# Altium footprint library Miscellaneous THD.PcbLib: 216 footprints (part 14 of 15)
Each footprint in its own frame and in the unit in brackets; x right, y up, seen from the top. Pads: shape width x height; smd on the part's side, far side on the other; paste and mask are expansions set on the pad; w line width, h text height; cw(c..) or ccw(c..) is an arc to the next point about the centre after c.
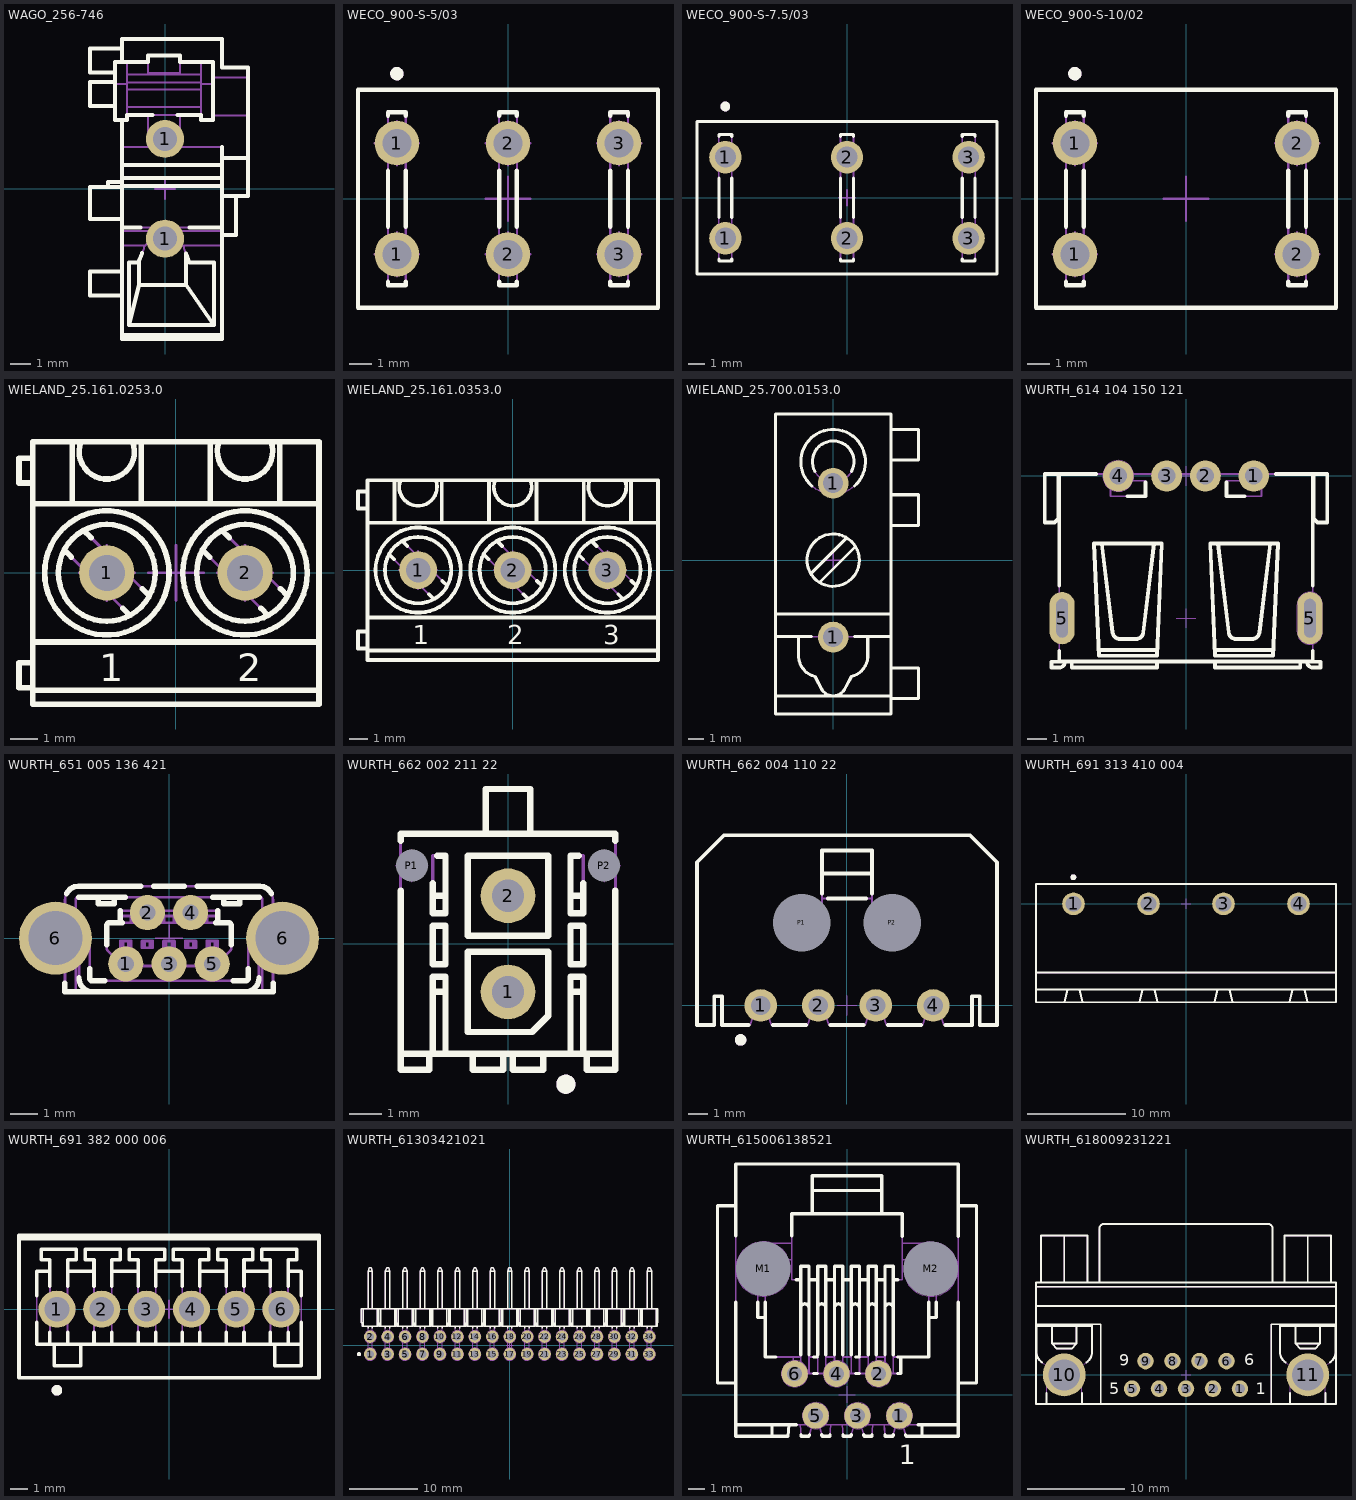
[diagram p13: the footprints below, top view; thin cyan lines are the x and y axes]

## WAGO_256-746 [mm] "24A 630VAC Modular PCB terminal block 2 solder pins / pole 1 pole pin Pitch 5mm, CAGE CLAMP® Connection"
height 18.2
pads (2):
  round 1.9 hole 1.2: 1(0,-2.5) 1(0,2.5)
Top Overlay:
  lines w0.2: -2.85,0.09 -2.85,0.35 -2.15,0.35 ; -2.5,4.135 -3.75,4.135 -3.75,5.335 -2.5,5.335 ; -2.5,5.832 -3.75,5.832 -3.75,7.032 -2.15,7.032 ; -2.15,-7.332 2.85,-7.332 ; -2.15,-5.341 -3.75,-5.341 -3.75,-4.141 -2.15,-4.141 ; -2.15,-1.947 -1.232,-1.947 ; -2.15,-1.51 -3.75,-1.51 -3.75,0.09 -2.15,0.09 ; -2.15,0.138 2.85,0.138 ; -2.15,0.547 2.85,0.547 ; -2.15,1.187 2.85,1.187 ; -2.15,3.448 -2.15,-7.522 2.85,-7.522 2.85,-2.31 ; -2.15,6.349 -2.15,7.5 2.85,7.5 2.85,6.078 4.15,6.078 ; -1.315,-3.68 -1.8,-3.68 -1.8,-6.826 ; -1.144,-3.217 -1.3,-3.599 -1.3,-4.811 ; -0.615,3.702 -1.9,3.702 -1.9,3.448 -2.5,3.448 -2.5,6.349 -0.85,6.349 -0.85,6.669 0.75,6.669 0.75,6.349 2.4,6.349 2.4,3.448 1.8,3.448 1.8,3.702 0.615,3.702 ; 1.05,-3.248 1.05,-4.811 ; 1.076,-3.316 1.215,-3.68 2.45,-3.68 2.45,-6.826 ; 1.232,-1.947 2.85,-1.947 ; 2.85,-1.304 2.85,-2.31 ; 2.85,-0.356 4.15,-0.356 ; 2.85,1.553 4.15,1.553 ; 2.85,2.091 2.85,-2.31 ; 3.55,-0.356 3.55,-2.31 ; -1.8,-6.826 -1.3,-4.811 ; -1.8,-6.826 2.45,-6.826 ; -1.3,-4.811 1.05,-4.811 ; 1.05,-4.811 2.45,-6.826 ; 2.85,-2.31 3.55,-2.31 ; 2.85,-2.31 3.55,-2.31 ; 4.15,-0.356 4.15,6.078 ; 4.15,-0.356 4.15,6.078
Mechanical 8:
  lines w0.1: -0.5,-2.5 0,-2.5 ; -0.5,0 0,0 ; -0.5,2.5 0,2.5 ; 0,-3 0,-2.5 ; 0,-2 0,-2.5 ; 0,-0.5 0,0 ; 0,0.5 0,0 ; 0,2 0,2.5 ; 0,3 0,2.5 ; 0.5,-2.5 0,-2.5 ; 0.5,0 0,0 ; 0.5,2.5 0,2.5
Mechanical 14:
  lines w0.1: -2.85,0.09 -2.85,0.35 -2.15,0.35 ; -2.5,4.135 -3.75,4.135 -3.75,5.335 -2.5,5.335 ; -2.5,5.25 -1.9,5.25 ; -2.5,5.832 -3.75,5.832 -3.75,7.032 -2.15,7.032 ; -2.15,-7.332 2.85,-7.332 ; -2.15,-5.341 -3.75,-5.341 -3.75,-4.141 -2.15,-4.141 ; -2.15,-2.831 -0.989,-2.831 ; -2.15,-2.124 2.85,-2.124 ; -2.15,-1.947 2.85,-1.947 ; -2.15,-1.51 -3.75,-1.51 -3.75,0.09 -2.15,0.09 ; -2.15,0.138 2.85,0.138 ; -2.15,0.547 2.85,0.547 ; -2.15,1.187 2.85,1.187 ; -2.15,2.091 2.85,2.091 2.85,-2.31 ; -2.15,3.448 -2.15,-7.522 2.85,-7.522 2.85,-2.31 ; -2.15,6.349 -2.15,7.5 2.85,7.5 2.85,6.078 4.15,6.078 ; -1.9,3.702 1.8,3.702 ; -1.9,4.091 1.8,4.091 ; -1.9,4.978 1.8,4.978 ; -1.9,5.31 1.8,5.31 ; -1.9,5.728 1.8,5.728 ; -1.9,6.349 -1.9,3.448 -2.5,3.448 -2.5,6.349 -0.85,6.349 ; -1.315,-3.68 -1.8,-3.68 -1.8,-6.826 ; -0.85,2.091 -0.85,3.702 ; -0.85,2.327 0.75,2.327 ; 0.75,2.091 0.75,3.702 ; 0.75,6.349 2.4,6.349 2.4,3.448 1.8,3.448 1.8,6.349 ; 0.888,-2.831 2.85,-2.831 ; 1.05,-3.248 1.05,-4.811 ; 1.8,5.25 2.4,5.25 ; 2.4,3.672 4.15,3.672 ; 2.4,5.573 4.15,5.573 ; 2.85,-0.356 4.15,-0.356 ; 2.85,1.553 4.15,1.553 ; -1.8,-6.826 -1.3,-4.811 ; -1.8,-6.826 2.45,-6.826 ; -1.3,-4.811 -1.3,-3.599 -1.05,-2.986 -1.05,-2.896 cw(c-0.05,-3.785) 0.95,-2.897 0.95,-2.986 1.215,-3.68 2.45,-3.68 2.45,-6.826 ; -1.3,-4.811 1.05,-4.811 ; 1.05,-4.811 2.45,-6.826 ; 2.85,-2.31 3.55,-2.31 ; 2.85,-2.31 3.55,-2.31 ; 3.55,-2.31 3.55,-0.356 3.55,-2.31 ; 4.15,-0.356 4.15,6.078 ; 4.15,-0.356 4.15,6.078 ; -0.85,5.803 0.75,5.803 0.75,6.669 -0.85,6.669 -0.85,5.803
3D body "WAGO_256-746.stp": height 18.81, standoff -4, extent -3.75,-7.525 4.15,7.5

## WECO_900-S-5/03 [mm] "5mm Spacing, 3 Tabs 6.3mmx2.8mm Connectors for Printed Circuit Boards"
height 15
pads (6):
  round 2 hole 1.3: 1(-5,-2.5) 1(-5,2.5) 2(0,-2.5) 2(0,2.5) 3(5,-2.5) 3(5,2.5)
Top Overlay:
  circle w0.3: c-5,5.628 r0.15
  lines w0.2: -5.4,-3.737 -5.4,-3.9 -4.6,-3.9 -4.6,-3.737 ; -5.4,-1.263 -5.4,1.263 ; -5.4,3.737 -5.4,3.9 -4.6,3.9 -4.6,3.737 ; -4.6,-1.263 -4.6,1.263 ; -0.4,-3.737 -0.4,-3.9 0.4,-3.9 0.4,-3.737 ; -0.4,-1.263 -0.4,1.263 ; -0.4,3.737 -0.4,3.9 0.4,3.9 0.4,3.737 ; 0.4,-1.263 0.4,1.263 ; 4.6,-3.737 4.6,-3.9 5.4,-3.9 5.4,-3.737 ; 4.6,-1.263 4.6,1.263 ; 4.6,3.737 4.6,3.9 5.4,3.9 5.4,3.737 ; 5.4,-1.263 5.4,1.263 ; -6.75,-4.9 -6.75,4.9 6.75,4.9 6.75,-4.9 -6.75,-4.9
Mechanical 8:
  lines w0.1: -6,-2.5 -5,-2.5 ; -6,2.5 -5,2.5 ; -5,-3.5 -5,-2.5 ; -5,-1.5 -5,-2.5 ; -5,1.5 -5,2.5 ; -5,3.5 -5,2.5 ; -4,-2.5 -5,-2.5 ; -4,2.5 -5,2.5 ; -1,-2.5 0,-2.5 ; -1,0 0,0 ; -1,2.5 0,2.5 ; 0,-3.5 0,-2.5 ; 0,-1.5 0,-2.5 ; 0,-1 0,0 ; 0,1 0,0 ; 0,1.5 0,2.5 ; 0,3.5 0,2.5 ; 1,-2.5 0,-2.5 ; 1,0 0,0 ; 1,2.5 0,2.5 ; 4,-2.5 5,-2.5 ; 4,2.5 5,2.5 ; 5,-3.5 5,-2.5 ; 5,-1.5 5,-2.5 ; 5,1.5 5,2.5 ; 5,3.5 5,2.5 ; 6,-2.5 5,-2.5 ; 6,2.5 5,2.5
Mechanical 14:
  circle w0.3: c-5,5.628 r0.15
  lines w0.1: -6.75,-4.9 -6.75,4.9 6.75,4.9 6.75,-4.9 -6.75,-4.9 ; -5.4,-3.9 -5.4,3.9 -4.6,3.9 -4.6,-3.9 -5.4,-3.9 ; -0.4,-3.9 -0.4,3.9 0.4,3.9 0.4,-3.9 -0.4,-3.9 ; 4.6,-3.9 4.6,3.9 5.4,3.9 5.4,-3.9 4.6,-3.9
3D body "WECO_900-S-5-03.stp": height 15, standoff -4.5, extent -6.75,-4.9 6.75,4.9

## WECO_900-S-7.5/03 [mm] "7.5mm Spacing, 3 Tabs 6.3mmx2.8mm Connectors for Printed Circuit Boards"
height 15
pads (6):
  round 2 hole 1.3: 1(-7.5,-2.5) 1(-7.5,2.5) 2(0,-2.5) 2(0,2.5) 3(7.5,-2.5) 3(7.5,2.5)
Top Overlay:
  circle w0.3: c-7.5,5.628 r0.15
  lines w0.2: -7.9,-3.789 -7.9,-3.896 -7.1,-3.896 -7.1,-3.789 ; -7.9,-1.211 -7.9,1.211 ; -7.9,3.789 -7.9,3.904 -7.1,3.904 -7.1,3.789 ; -7.1,-1.211 -7.1,1.211 ; -0.4,-3.789 -0.4,-3.896 0.4,-3.896 0.4,-3.789 ; -0.4,-1.211 -0.4,1.211 ; -0.4,3.789 -0.4,3.904 0.4,3.904 0.4,3.789 ; 0.4,-1.211 0.4,1.211 ; 7.1,-3.789 7.1,-3.896 7.9,-3.896 7.9,-3.789 ; 7.1,-1.211 7.1,1.211 ; 7.1,3.789 7.1,3.904 7.9,3.904 7.9,3.789 ; 7.9,-1.211 7.9,1.211 ; -9.25,-4.7 -9.25,4.7 9.25,4.7 9.25,-4.7 -9.25,-4.7
Mechanical 8:
  lines w0.1: -8,-2.5 -7.5,-2.5 ; -8,2.5 -7.5,2.5 ; -7.5,-3 -7.5,-2.5 ; -7.5,-2 -7.5,-2.5 ; -7.5,2 -7.5,2.5 ; -7.5,3 -7.5,2.5 ; -7,-2.5 -7.5,-2.5 ; -7,2.5 -7.5,2.5 ; -0.5,-2.5 0,-2.5 ; -0.5,0 0,0 ; -0.5,2.5 0,2.5 ; 0,-3 0,-2.5 ; 0,-2 0,-2.5 ; 0,-0.5 0,0 ; 0,0.5 0,0 ; 0,2 0,2.5 ; 0,3 0,2.5 ; 0.5,-2.5 0,-2.5 ; 0.5,0 0,0 ; 0.5,2.5 0,2.5 ; 7,-2.5 7.5,-2.5 ; 7,2.5 7.5,2.5 ; 7.5,-3 7.5,-2.5 ; 7.5,-2 7.5,-2.5 ; 7.5,2 7.5,2.5 ; 7.5,3 7.5,2.5 ; 8,-2.5 7.5,-2.5 ; 8,2.5 7.5,2.5
Mechanical 14:
  circle w0.3: c-7.5,5.628 r0.15
  lines w0.1: -9.25,-4.7 -9.25,4.7 9.25,4.7 9.25,-4.7 -9.25,-4.7 ; -7.9,-3.896 -7.9,3.904 -7.1,3.904 -7.1,-3.896 -7.9,-3.896 ; -0.4,-3.896 -0.4,3.904 0.4,3.904 0.4,-3.896 -0.4,-3.896 ; 7.1,-3.896 7.1,3.904 7.9,3.904 7.9,-3.896 7.1,-3.896
3D body "WECO_900-S-7.5-03.stp": height 15, standoff -4.5, extent -9.25,-4.7 9.25,4.7

## WECO_900-S-10/02 [mm] "10mm Spacing, 2 Tabs 6.3mmx2.8mm Connectors for Printed Circuit Boards"
height 15
pads (4):
  round 2 hole 1.3: 1(-5,-2.5) 1(-5,2.5) 2(5,-2.5) 2(5,2.5)
Top Overlay:
  circle w0.3: c-5,5.628 r0.15
  lines w0.2: -5.4,-3.737 -5.4,-3.9 -4.6,-3.9 -4.6,-3.737 ; -5.4,-1.263 -5.4,1.263 ; -5.4,3.737 -5.4,3.9 -4.6,3.9 -4.6,3.737 ; -4.6,-1.263 -4.6,1.263 ; 4.6,-3.737 4.6,-3.9 5.4,-3.9 5.4,-3.737 ; 4.6,-1.263 4.6,1.263 ; 4.6,3.737 4.6,3.9 5.4,3.9 5.4,3.737 ; 5.4,-1.263 5.4,1.263 ; -6.75,-4.9 -6.75,4.9 6.75,4.9 6.75,-4.9 -6.75,-4.9
Mechanical 8:
  lines w0.1: -6,-2.5 -5,-2.5 ; -6,2.5 -5,2.5 ; -5,-3.5 -5,-2.5 ; -5,-1.5 -5,-2.5 ; -5,1.5 -5,2.5 ; -5,3.5 -5,2.5 ; -4,-2.5 -5,-2.5 ; -4,2.5 -5,2.5 ; -1,0 0,0 ; 0,-1 0,0 ; 0,1 0,0 ; 1,0 0,0 ; 4,-2.5 5,-2.5 ; 4,2.5 5,2.5 ; 5,-3.5 5,-2.5 ; 5,-1.5 5,-2.5 ; 5,1.5 5,2.5 ; 5,3.5 5,2.5 ; 6,-2.5 5,-2.5 ; 6,2.5 5,2.5
Mechanical 14:
  circle w0.3: c-5,5.628 r0.15
  lines w0.1: -6.75,-4.9 -6.75,4.9 6.75,4.9 6.75,-4.9 -6.75,-4.9 ; -5.4,-3.9 -5.4,3.9 -4.6,3.9 -4.6,-3.9 -5.4,-3.9 ; 4.6,-3.9 4.6,3.9 5.4,3.9 5.4,-3.9 4.6,-3.9
3D body "WECO_900-S-10-02.stp": height 15, standoff -4.5, extent -6.75,-4.9 6.75,4.9

## WIELAND_25.161.0253.0 [mm] "Terminal Block, Pitch 5mm, 2 Positions, Screw Connection"
height 15
pads (2):
  round 2 hole 1.3: 1(-2.5,0) 2(2.5,0)
Top Overlay:
  circle w0.2: c-2.5,0 r1.75
  circle w0.2: c-2.5,0 r2.25
  circle w0.2: c2.5,0 r1.75
  circle w0.2: c2.5,0 r2.25
  lines w0.2: -5.175,-4.25 5.175,-4.25 ; -5.175,-4.15 -5.675,-4.15 -5.675,-3.25 -5.175,-3.25 ; -5.175,-2.5 5.175,-2.5 ; -5.175,2.5 5.175,2.5 ; -5.175,3.25 -5.675,3.25 -5.675,4.15 -5.175,4.15 ; -4.039,0.832 -3.778,0.571 ; -3.75,2.5 -3.75,4.75 ; -3.433,4.75 ccw(c-2.5,4.391) -1.567,4.75 ; -3.332,1.539 -3.071,1.278 ; -1.929,-1.278 -1.668,-1.539 ; -1.25,2.5 -1.25,4.75 ; -1.222,-0.571 -0.961,-0.832 ; 0.961,0.832 1.222,0.571 ; 1.25,2.5 1.25,4.75 ; 1.567,4.75 ccw(c2.5,4.391) 3.433,4.75 ; 1.668,1.539 1.929,1.278 ; 3.071,-1.278 3.332,-1.539 ; 3.75,2.5 3.75,4.75 ; 3.778,-0.571 4.039,-0.832 ; -5.175,-4.75 -5.175,4.75 5.175,4.75 5.175,-4.75 -5.175,-4.75
  text "1" at -2.78,-3.922 h1
  text "2" at 2.219,-3.922 h1
Mechanical 8:
  lines w0.1: -3.5,0 -2.5,0 ; -2.5,-1 -2.5,0 ; -2.5,1 -2.5,0 ; -1.5,0 -2.5,0 ; -1,0 0,0 ; 0,-1 0,0 ; 0,1 0,0 ; 1,0 0,0 ; 1.5,0 2.5,0 ; 2.5,-1 2.5,0 ; 2.5,1 2.5,0 ; 3.5,0 2.5,0
Mechanical 14:
  circle w0.1: c-2.5,0 r2.25
  circle w0.1: c2.5,0 r2.25
  circle w0.1: c-2.5,0 r1.75
  circle w0.1: c2.5,0 r1.75
  lines w0.1: -5.175,-4.25 5.175,-4.25 ; -5.175,-4.15 -5.675,-4.15 -5.675,-3.25 -5.175,-3.25 ; -5.175,-2.5 5.175,-2.5 ; -5.175,2.5 5.175,2.5 ; -5.175,3.25 -5.675,3.25 -5.675,4.15 -5.175,4.15 ; -4.039,0.832 -1.668,-1.539 ; -3.75,2.5 -3.75,4.75 ; -3.433,4.75 ccw(c-2.5,4.391) -1.567,4.75 ; -3.332,1.539 -0.961,-0.832 ; -1.25,2.5 -1.25,4.75 ; 0.961,0.832 3.332,-1.539 ; 1.25,2.5 1.25,4.75 ; 1.567,4.75 ccw(c2.5,4.391) 3.433,4.75 ; 1.668,1.539 4.039,-0.832 ; 3.75,2.5 3.75,4.75 ; -5.175,-4.75 -5.175,4.75 5.175,4.75 5.175,-4.75 -5.175,-4.75
  text "2" at 2.219,-3.922 h1
  text "1" at -2.78,-3.922 h1
3D body "WIELAND_25.161.0253.0.stp": height 15, standoff -3.4, extent -5.675,-4.75 5.175,4.75

## WIELAND_25.161.0353.0 [mm] "Terminal Block, Pitch 5mm, 3 Positions, Screw Connection"
height 15
pads (3):
  round 2 hole 1.3: 1(-5,0) 2(0,0) 3(5,0)
Top Overlay:
  circle w0.2: c-5,0 r2.25
  circle w0.2: c0,0 r2.25
  circle w0.2: c5,0 r2.25
  circle w0.2: c-5,0 r1.75
  circle w0.2: c0,0 r1.75
  circle w0.2: c5,0 r1.75
  lines w0.2: -7.675,-4.25 7.675,-4.25 ; -7.675,-4.15 -8.175,-4.15 -8.175,-3.25 -7.675,-3.25 ; -7.675,-2.5 7.675,-2.5 ; -7.675,2.5 7.675,2.5 ; -7.675,3.25 -8.175,3.25 -8.175,4.15 -7.675,4.15 ; -6.539,0.832 -6.278,0.571 ; -6.25,2.5 -6.25,4.75 ; -5.933,4.75 ccw(c-5,4.391) -4.067,4.75 ; -5.832,1.539 -5.571,1.278 ; -4.429,-1.278 -4.168,-1.539 ; -3.75,2.5 -3.75,4.75 ; -3.722,-0.571 -3.461,-0.832 ; -1.539,0.832 -1.278,0.571 ; -1.25,2.5 -1.25,4.75 ; -0.933,4.75 ccw(c0,4.391) 0.933,4.75 ; -0.832,1.539 -0.571,1.278 ; 0.571,-1.278 0.832,-1.539 ; 1.25,2.5 1.25,4.75 ; 1.278,-0.571 1.539,-0.832 ; 3.461,0.832 3.722,0.571 ; 3.75,2.5 3.75,4.75 ; 4.067,4.75 ccw(c5,4.391) 5.933,4.75 ; 4.168,1.539 4.429,1.278 ; 5.571,-1.278 5.832,-1.539 ; 6.25,2.5 6.25,4.75 ; 6.278,-0.571 6.539,-0.832 ; -7.675,-4.75 -7.675,4.75 7.675,4.75 7.675,-4.75 -7.675,-4.75
  text "3" at 4.78,-3.922 h1
  text "2" at -0.281,-3.922 h1
  text "1" at -5.28,-3.922 h1
Mechanical 8:
  lines w0.1: -6,0 -5,0 ; -5,-1 -5,0 ; -5,1 -5,0 ; -4,0 -5,0 ; -1,0 0,0 ; 0,-1 0,0 ; 0,1 0,0 ; 1,0 0,0 ; 4,0 5,0 ; 5,-1 5,0 ; 5,1 5,0 ; 6,0 5,0
Mechanical 14:
  circle w0.1: c-5,0 r2.25
  circle w0.1: c0,0 r2.25
  circle w0.1: c5,0 r2.25
  circle w0.1: c-5,0 r1.75
  circle w0.1: c0,0 r1.75
  circle w0.1: c5,0 r1.75
  lines w0.1: -7.675,-4.25 7.675,-4.25 ; -7.675,-4.15 -8.175,-4.15 -8.175,-3.25 -7.675,-3.25 ; -7.675,-2.5 7.675,-2.5 ; -7.675,2.5 7.675,2.5 ; -7.675,3.25 -8.175,3.25 -8.175,4.15 -7.675,4.15 ; -6.539,0.832 -4.168,-1.539 ; -6.25,2.5 -6.25,4.75 ; -5.933,4.75 ccw(c-5,4.391) -4.067,4.75 ; -5.832,1.539 -3.461,-0.832 ; -3.75,2.5 -3.75,4.75 ; -1.539,0.832 0.832,-1.539 ; -1.25,2.5 -1.25,4.75 ; -0.933,4.75 ccw(c0,4.391) 0.933,4.75 ; -0.832,1.539 1.539,-0.832 ; 1.25,2.5 1.25,4.75 ; 3.461,0.832 5.832,-1.539 ; 3.75,2.5 3.75,4.75 ; 4.067,4.75 ccw(c5,4.391) 5.933,4.75 ; 4.168,1.539 6.539,-0.832 ; 6.25,2.5 6.25,4.75 ; -7.675,-4.75 -7.675,4.75 7.675,4.75 7.675,-4.75 -7.675,-4.75
  text "3" at 4.78,-3.922 h1
  text "2" at -0.281,-3.922 h1
  text "1" at -5.28,-3.922 h1
3D body "WIELAND_25.161.0353.0.stp": height 15, standoff -3.4, extent -8.175,-4.75 7.675,4.75

## WIELAND_25.700.0153.0 [mm] "Terminal Block, 1 Pole, Pitch 7.5mm, Screw Connection, Series: 8375/1/7,5"
height 22
pads (2):
  round 2 hole 1.3: 1(0,-5) 1(0,5)
Top Overlay:
  circle w0.2: c0,0 r1.7
  lines w0.2: -3.75,-8.825 3.75,-8.829 ; -3.75,-4.975 -1.4,-4.975 ; -3.75,-3.5 3.75,-3.5 ; -2.25,-4.975 -2.25,-6.306 ccw(c-0.844,-6.198) -1.186,-7.566 -0.726,-8.424 ccw(c0,-7.972) 0.726,-8.424 1.186,-7.566 ccw(c0.844,-6.198) 2.25,-6.306 2.25,-4.975 ; -1.451,-0.885 0.886,1.451 ; -1.389,4.825 cw(c0,6.4) 1.389,4.825 ; -1.183,5.749 cw(c0,6.4) 1.183,5.749 ; -0.885,-1.451 1.451,0.885 ; 1.4,-4.975 3.75,-4.975 ; 3.75,-9 5.55,-9 5.55,-7 3.75,-7 ; 3.75,2.25 5.55,2.25 5.55,4.25 3.75,4.25 ; 3.75,6.5 5.55,6.5 5.55,8.5 3.75,8.5 ; -3.75,-10 -3.75,9.5 3.75,9.5 3.75,-10 -3.75,-10
Mechanical 8:
  lines w0.1: -0.5,-5 0,-5 ; -0.5,0 0,0 ; -0.5,5 0,5 ; 0,-5.5 0,-5 ; 0,-4.5 0,-5 ; 0,-0.5 0,0 ; 0,0.5 0,0 ; 0,4.5 0,5 ; 0,5.5 0,5 ; 0.5,-5 0,-5 ; 0.5,0 0,0 ; 0.5,5 0,5
Mechanical 14:
  circle w0.1: c0,6.4 r1.35
  circle w0.1: c0,0 r1.7
  circle w0.1: c0,6.4 r2.1
  lines w0.1: -3.75,-8.825 3.75,-8.829 ; -3.75,-4.975 3.75,-4.975 ; -3.75,-3.5 3.75,-3.5 ; -2.25,-4.975 -2.25,-6.306 ccw(c-0.844,-6.198) -1.186,-7.566 -0.726,-8.424 ccw(c0,-7.972) 0.726,-8.424 1.186,-7.566 ccw(c0.844,-6.198) 2.25,-6.306 2.25,-4.975 ; -1.451,-0.885 0.886,1.451 ; -0.885,-1.451 1.451,0.885 ; 3.75,-9 5.55,-9 5.55,-7 3.75,-7 ; 3.75,2.25 5.55,2.25 5.55,4.25 3.75,4.25 ; 3.75,6.5 5.55,6.5 5.55,8.5 3.75,8.5 ; -3.75,-10 -3.75,9.5 3.75,9.5 3.75,-10 -3.75,-10
3D body "WIELAND_25.700.0153.0.stp": height 22, standoff -5, extent -3.75,-10 5.55,9.5

## WURTH_614 104 150 121 [mm] "Horizontal USB2.0 A Type Receptacle, SLIM Type, 4 Contacts"
height 7.2
pads (6):
  round 1.6 hole 0.9: 1(3.5,0) 2(1,0) 3(-1,0) 4(-3.5,0)
  oval 1.3x2.7 hole 0.6 slot 2 at 90 deg: 5(-6.4,-7.35) 5(6.4,-7.35)
Top Overlay:
  lines w0.2: -6.6,0.1 -6.6,-2.2 -6.8,-2.4 -7.3,-2.4 -7.3,0.1 -4.646,0.1 ; -6.55,-9.039 -6.55,-9.59 ; -6.55,-5.661 -6.55,0.1 ; -6.25,-9.59 cw(c-6.56,-9.59) -6.56,-9.9 -6.95,-9.9 -6.95,-9.6 -6.56,-9.6 ccw(c-6.56,-9.59) -6.55,-9.59 ; -5.9,-9.59 -5.9,-9.9 -1.5,-9.9 -1.5,-9.59 ; -4.513,-9 -1.488,-9 ; -4.35,-3.49 -3.791,-8.093 ccw(c-3.413,-8.047) -3.413,-8.427 -2.587,-8.427 ccw(c-2.587,-8.047) -2.209,-8.093 -1.65,-3.49 ; -3.031,-1.05 -2.1,-1.05 -2.1,-0.335 ; 1.488,-9 4.513,-9 ; 1.5,-9.59 1.5,-9.9 5.9,-9.9 5.9,-9.59 ; 1.65,-3.49 2.209,-8.093 ccw(c2.587,-8.047) 2.587,-8.427 3.413,-8.427 ccw(c3.413,-8.047) 3.791,-8.093 4.35,-3.49 ; 2.1,-0.335 2.1,-1.05 3.031,-1.05 ; 4.646,0.1 7.3,0.1 7.3,-2.4 6.8,-2.4 6.6,-2.2 6.6,0.1 ; 6.25,-9.59 ccw(c6.56,-9.59) 6.56,-9.9 6.95,-9.9 6.95,-9.6 6.56,-9.6 cw(c6.56,-9.59) 6.55,-9.59 ; 6.55,-9.039 6.55,-9.59 ; 6.55,-5.661 6.55,0.1 ; -6.55,-9.59 6.55,-9.59 ; -4.75,-3.49 -1.25,-3.49 -1.5,-9.29 -4.5,-9.29 -4.75,-3.49 ; 1.25,-3.49 4.75,-3.49 4.5,-9.29 1.5,-9.29 1.25,-3.49
Mechanical 8:
  circle w0.05: c-3.5,0 r0.45
  circle w0.05: c-1,0 r0.45
  circle w0.05: c1,0 r0.45
  circle w0.05: c3.5,0 r0.45
  circle w0.05: c-3.5,0 r0.8
  lines w0.05: -6.7,-7.35 -6.4,-7.35 ; -6.4,-8.05 -6.4,-7.35 ; -6.4,-6.65 -6.4,-7.35 ; -6.1,-7.35 -6.4,-7.35 ; -4,0 -3.5,0 ; -3.5,-0.5 -3.5,0 ; -3.5,0.5 -3.5,0 ; -3,0 -3.5,0 ; -1.5,0 -1,0 ; -1,-0.5 -1,0 ; -1,0.5 -1,0 ; -0.5,-7.35 0,-7.35 ; 0,-7.85 0,-7.35 ; 0,-6.85 0,-7.35 ; 0,-0.5 0,0 ; 0,0.5 0,0 ; 0.5,-7.35 0,-7.35 ; 1,-0.5 1,0 ; 1,0.5 1,0 ; 1.5,0 1,0 ; 3,0 3.5,0 ; 3.5,-0.5 3.5,0 ; 3.5,0.5 3.5,0 ; 4,0 3.5,0 ; 6.1,-7.35 6.4,-7.35 ; 6.4,-8.05 6.4,-7.35 ; 6.4,-6.65 6.4,-7.35 ; 6.7,-7.35 6.4,-7.35 ; -1,0 -0.5,0 0,0 ; 0,0 0.5,0 1,0 ; -6.7,-8.05 ccw(c-6.4,-8.05) -6.1,-8.05 -6.1,-6.65 ccw(c-6.4,-6.65) -6.7,-6.65 -6.7,-8.05 ; 5.75,-8.05 ccw(c6.4,-8.05) 7.05,-8.05 7.05,-6.65 ccw(c6.4,-6.65) 5.75,-6.65 5.75,-8.05 ; 6.1,-8.05 ccw(c6.4,-8.05) 6.7,-8.05 6.7,-6.65 ccw(c6.4,-6.65) 6.1,-6.65 6.1,-8.05
Mechanical 14:
  lines w0.1: -6.6,-1.05 -6.55,-1.05 ; -6.6,0.1 -6.6,-2.2 -6.8,-2.4 -7.3,-2.4 -7.3,0.1 7.3,0.1 7.3,-2.4 6.8,-2.4 6.6,-2.2 6.6,0.1 ; -6.55,0.1 -6.55,-9.59 ; -6.25,-9.59 cw(c-6.56,-9.59) -6.56,-9.9 -6.95,-9.9 -6.95,-9.6 -6.56,-9.6 ccw(c-6.56,-9.59) -6.55,-9.59 ; -5.9,-9.59 -5.9,-9.9 -1.5,-9.9 -1.5,-9.59 ; -4.513,-9 -1.488,-9 ; -4.35,-3.49 -3.791,-8.093 ccw(c-3.413,-8.047) -3.413,-8.427 -2.587,-8.427 ccw(c-2.587,-8.047) -2.209,-8.093 -1.65,-3.49 ; 1.488,-9 4.513,-9 ; 1.5,-9.59 1.5,-9.9 5.9,-9.9 5.9,-9.59 ; 1.65,-3.49 2.209,-8.093 ccw(c2.587,-8.047) 2.587,-8.427 3.413,-8.427 ccw(c3.413,-8.047) 3.791,-8.093 4.35,-3.49 ; 6.25,-9.59 ccw(c6.56,-9.59) 6.56,-9.9 6.95,-9.9 6.95,-9.6 6.56,-9.6 cw(c6.56,-9.59) 6.55,-9.59 ; 6.55,-1.05 6.6,-1.05 ; 6.55,0.1 6.55,-9.59 ; -6.55,-9.59 6.55,-9.59 ; -4.75,-3.49 -1.25,-3.49 -1.5,-9.29 -4.5,-9.29 -4.75,-3.49 ; -3.9,-1.05 -2.1,-1.05 -2.1,-0.25 -3.9,-0.25 -3.9,-1.05 ; 1.25,-3.49 4.75,-3.49 4.5,-9.29 1.5,-9.29 1.25,-3.49 ; 2.1,-1.05 2.1,-0.25 3.9,-0.25 3.9,-1.05 2.1,-1.05
3D body "WURTH_614 104 150 121.stp": height 7.22, standoff -1.6, extent -7.3,-9.9 7.3,0.1
